# Altium schematic symbol library Minh_Lib.SchLib: 619 symbols (part 1 of 4) (continued)
## C1206C106J4RACTU
designator C?  Supplier Part Number 1: 96Y5637
Cap Ceramic 10uF 16V X7R 5% SMD 1206 125C Plastic T/R; Manufacturer: KEMET; Manufacturer Part Number: C1206C106J4RACTU; Supplier 1: Newark; RoHS: Yes; Category: Ceramic Capacitors; Stock 1: 60; Pricing 1: 5=3.14000, 10=2.49000, 25=2.30000, 50=2.11000, 100=1.93000 (USD); Mount: Surface Mount; Case/Package: 1206; Dielectric Material: Ceramic; Case Code (Metric): 3216; Case Code (Imperial): 1206; Min Operating Temperature: -55°C; Max Operating Temperature: 125°C; Capacitance: 10uF; Tolerance: 5%; Voltage Rating (DC): 16V; Dielectric: X7R; Package Quantity: 1; Voltage Rating: 16V; Packaging: Tape and Reel; Termination: SMD/SMT; Dissipation Factor: 5%; Series: C; Length: 3.2mm; Width: 0.063inch; Height: 1.6mm; Thickness: 0.071inch; Depth: 1.6mm; Radiation Hardening: No; RoHS Compliant: Yes; REACH SVHC: No SVHC; ComponentLink1URL: http://www.farnell.com/datasheets/2746115.pdf?src-supplier=Farnell; ComponentLink1Description: http://www.farnell.com/datasheets/2746115.pdf?src-supplier=Farnell; ComponentLink2URL: http://www.mouser.com/ds/2/212/KEM_C1002_X7R_SMD-1102033.pdf?src-supplier=Mouser; ComponentLink2Description: http://www.mouser.com/ds/2/212/KEM_C1002_X7R_SMD-1102033.pdf?src-supplier=Mouser; ComponentLink3URL: http://components.arrow.com/part/dataview/0323_00339521?src-supplier=Arrow+Europe; ComponentLink3Description: http://components.arrow.com/part/dataview/0323_00339521?src-supplier=Arrow+Europe; ComponentLink4URL: http://components.arrow.com/part/dataview/46514886S8616008N7429?src-supplier=Arrow+Electronics; ComponentLink4Description: http://components.arrow.com/part/dataview/46514886S8616008N7429?src-supplier=Arrow+Electronics; ComponentLink5URL: https://api.kemet.com/component-edge/download/datasheet/C1206C106J4RACTU.pdf?src-supplier=Digi-Key; ComponentLink5Description: https://api.kemet.com/component-edge/download/datasheet/C1206C106J4RACTU.pdf?src-supplier=Digi-Key; ComponentLink6URL: http://www.farnell.com/datasheets/2746115.pdf?src-supplier=Newark; ComponentLink6Description: http://www.farnell.com/datasheets/2746115.pdf?src-supplier=Newark; ComponentLink7URL: http://capacitoredge.kemet.com/capedge2/DataSheet?pn=C1206C106J4RAC7800&src-supplier=Avnet; ComponentLink7Description: http://capacitoredge.kemet.com/capedge2/DataSheet?pn=C1206C106J4RAC7800&src-supplier=Avnet; ComponentLink8URL: http://www.farnell.com/datasheets/2746115.pdf?src-supplier=Element14; ComponentLink8Description: http://www.farnell.com/datasheets/2746115.pdf?src-supplier=Element14
footprint CAP1206
pins: 1, 2

## C1206C106J8RACTU
designator C?  Supplier Part Number 1: 96Y7254
Cap Ceramic 10uF 10V X7R 5% SMD 1206 125°C Embossed Plastic T/R; Manufacturer: KEMET; Manufacturer Part Number: C1206C106J8RACTU; Supplier 1: Newark; RoHS: Yes; Category: Ceramic Capacitors; Stock 1: 711; Pricing 1: 1=0.48700, 10=0.48700, 25=0.48700, 50=0.48700, 100=0.48700 (USD); Mount: Surface Mount; Case/Package: 1206; Case Code (Imperial): 1206; Case Code (Metric): 3216; Dielectric Material: Ceramic; Min Operating Temperature: -55°C; Max Operating Temperature: 125°C; Capacitance: 10uF; Tolerance: 5%; Packaging: Tape and Reel; Dielectric: X7R; Voltage Rating (DC): 10V; Termination: SMD/SMT; Series: C; Package Quantity: 1; Voltage Rating: 10V; Length: 0.126inch; Width: 0.063inch; Depth: 1.6mm; Thickness: 0.071inch; RoHS Compliant: Yes; ComponentLink1URL: http://www.farnell.com/datasheets/2323763.pdf?src-supplier=Farnell; ComponentLink1Description: http://www.farnell.com/datasheets/2323763.pdf?src-supplier=Farnell; ComponentLink2URL: http://www.farnell.com/datasheets/2746428.pdf?src-supplier=Farnell; ComponentLink2Description: http://www.farnell.com/datasheets/2746428.pdf?src-supplier=Farnell; ComponentLink3URL: http://www.mouser.com/ds/2/212/KEM_C1002_X7R_SMD-1102033.pdf?src-supplier=Mouser; ComponentLink3Description: http://www.mouser.com/ds/2/212/KEM_C1002_X7R_SMD-1102033.pdf?src-supplier=Mouser; ComponentLink4URL: http://components.arrow.com/part/dataview/0323_00339679?src-supplier=Arrow+Europe; ComponentLink4Description: http://components.arrow.com/part/dataview/0323_00339679?src-supplier=Arrow+Europe; ComponentLink5URL: http://components.arrow.com/part/dataview/46514937S98325N7429?src-supplier=Arrow+Electronics; ComponentLink5Description: http://components.arrow.com/part/dataview/46514937S98325N7429?src-supplier=Arrow+Electronics; ComponentLink6URL: https://api.kemet.com/component-edge/download/datasheet/C1206C106J8RACTU.pdf?src-supplier=Digi-Key; ComponentLink6Description: https://api.kemet.com/component-edge/download/datasheet/C1206C106J8RACTU.pdf?src-supplier=Digi-Key; ComponentLink7URL: http://www.farnell.com/datasheets/2746428.pdf?src-supplier=Newark; ComponentLink7Description: http://www.farnell.com/datasheets/2746428.pdf?src-supplier=Newark; ComponentLink8URL: https://search.kemet.com/component-edge/download/datasheet/C1206C106J8RACTU.pdf?src-supplier=Digi-Key; ComponentLink8Description: https://search.kemet.com/component-edge/download/datasheet/C1206C106J8RACTU.pdf?src-supplier=Digi-Key
footprint CAP1206
pins: 1, 2

## C1206C106J9RACTU
designator C?  Supplier Part Number 1: 08P7799
Cap Cer 10UF 6.3V 5% X7R 1206; Manufacturer: KEMET; Manufacturer Part Number: C1206C106J9RACTU; Dielectric Material: Ceramic; Supplier 1: Newark; RoHS: Yes; Category: Ceramic Capacitors; Pricing 1: 2000=0.87500 (USD); Mount: Surface Mount; Case/Package: 1206; Min Operating Temperature: -55°C; Max Operating Temperature: 125°C; Capacitance: 10uF; Tolerance: 5%; Packaging: Tape and Reel; Package Quantity: 2000; Voltage Rating: 6.3V; Voltage Rating (DC): 6.3V; Length: 0.126inch; Width: 0.063inch; Thickness: 0.071inch; RoHS Compliant: Yes; ComponentLink1URL: https://search.kemet.com/component-edge/download/datasheet/C1206C106J9RACTU.pdf?src-supplier=Digi-Key; ComponentLink1Description: https://search.kemet.com/component-edge/download/datasheet/C1206C106J9RACTU.pdf?src-supplier=Digi-Key
footprint CAP1206
pins: 1, 2

## C1206C106K3PACTU
designator C?  Supplier Part Number 1: 6911199
贴片陶瓷电容 10uF ±10% 25V 1206; Manufacturer: KEMET; Manufacturer Part Number: C1206C106K3PACTU; Dielectric Material: Ceramic; Dielectric: X5R; Supplier 1: RSComponents; RoHS: Yes; Category: Ceramic Capacitors; Stock 1: 8950; Pricing 1: 10=0.72400, 50=0.68100, 100=0.63600, 250=0.59300, 500=0.54300 (USD); Mount: Surface Mount; Case/Package: 1206; Case Code (Imperial): 1206; Case Code (Metric): 3216; Min Operating Temperature: -55°C; Max Operating Temperature: 85°C; Capacitance: 10uF; Tolerance: 10%; Packaging: Tape and Reel; Voltage Rating: 25V; Voltage: 25V; Termination: SMD/SMT; Construction: Flat; Length: 3.2mm; Height: 1.6mm; Depth: 1.6mm; Radiation Hardening: No; RoHS Compliant: Yes; ComponentLink1URL: http://www.farnell.com/datasheets/2739687.pdf?src-supplier=Farnell; ComponentLink1Description: http://www.farnell.com/datasheets/2739687.pdf?src-supplier=Farnell; ComponentLink2URL: http://components.arrow.com/part/dataview/0323_00011384?src-supplier=Arrow+Europe; ComponentLink2Description: http://components.arrow.com/part/dataview/0323_00011384?src-supplier=Arrow+Europe; ComponentLink3URL: http://www.onlinecomponents.com/productFiles/mf-KEM/kem_c1006_x5r_smd.pdf?src-supplier=Onlinecomponents.com; ComponentLink3Description: http://www.onlinecomponents.com/productFiles/mf-KEM/kem_c1006_x5r_smd.pdf?src-supplier=Onlinecomponents.com; ComponentLink4URL: https://www.verical.com/server-webapp/html/getDatasheet?partID=385834&src-supplier=Verical; ComponentLink4Description: https://www.verical.com/server-webapp/html/getDatasheet?partID=385834&src-supplier=Verical; ComponentLink5URL: http://www.farnell.com/datasheets/2739687.pdf?src-supplier=Element14; ComponentLink5Description: http://www.farnell.com/datasheets/2739687.pdf?src-supplier=Element14; ComponentLink6URL: http://www.farnell.com/datasheets/2739687.pdf?src-supplier=Newark; ComponentLink6Description: http://www.farnell.com/datasheets/2739687.pdf?src-supplier=Newark; ComponentLink7URL: https://api.kemet.com/component-edge/download/datasheet/C1206C106K3PACTU.pdf?src-supplier=Digi-Key; ComponentLink7Description: https://api.kemet.com/component-edge/download/datasheet/C1206C106K3PACTU.pdf?src-supplier=Digi-Key
footprint CAP1206
pins: 1, 2

## C1206C106K4RACTU
designator C?  Supplier Part Number 1: 8029961
1206 C 10uF Ceramic Multilayer Capacitor; 16 VDC; +125degC; X7R Dielec; +/-10%; Manufacturer: KEMET; Manufacturer Part Number: C1206C106K4RACTU; Tolerance: 10%; Voltage Rating (DC): 16V; Dissipation Factor: 5%; Supplier 1: RSComponents; RoHS: Yes; Category: Ceramic Capacitors; Stock 1: 350; Pricing 1: 50=0.19000, 250=0.08200, 1000=0.07300 (USD); Mount: Surface Mount,PCB; Case/Package: 1206; Dielectric Material: Ceramic; Case Code (Metric): 3216; Case Code (Imperial): 1206; Min Operating Temperature: -55°C; Max Operating Temperature: 125°C; Capacitance: 10uF; Packaging: Tape and Reel; Dielectric: X7R; Termination: SMD/SMT; Voltage Rating: 16V; Series: C; Package Quantity: 1; Construction: Flat; Voltage: 16V; Length: 3.2mm; Width: 0.063inch; Height: 1.6mm; Depth: 1.6mm; Thickness: 0.071inch; Radiation Hardening: No; RoHS Compliant: Yes; REACH SVHC: No SVHC; ComponentLink1URL: https://datasheet.ciiva.com/5969/1732730-5969445.pdf?src-supplier=Farnell; ComponentLink1Description: https://datasheet.ciiva.com/5969/1732730-5969445.pdf?src-supplier=Farnell; ComponentLink2URL: https://datasheet.ciiva.com/5412/kem-c1002-x7r-smd-5412965.pdf?src-supplier=Mouser; ComponentLink2Description: https://datasheet.ciiva.com/5412/kem-c1002-x7r-smd-5412965.pdf?src-supplier=Mouser; ComponentLink3URL: https://datasheet.ciiva.com/14586/70095383-14586759.pdf?src-supplier=Allied+Electronics; ComponentLink3Description: https://datasheet.ciiva.com/14586/70095383-14586759.pdf?src-supplier=Allied+Electronics; ComponentLink4URL: https://datasheet.ciiva.com/14599/70095383-14599882.pdf?src-supplier=Allied+Electronics; ComponentLink4Description: https://datasheet.ciiva.com/14599/70095383-14599882.pdf?src-supplier=Allied+Electronics; ComponentLink5URL: https://datasheet.ciiva.com/7730/1851736-7730091.pdf?src-supplier=Element14; ComponentLink5Description: https://datasheet.ciiva.com/7730/1851736-7730091.pdf?src-supplier=Element14; ComponentLink6URL: https://datasheet.ciiva.com/18102/getdatasheetpartid-74004-18102523.pdf?src-supplier=Verical; ComponentLink6Description: https://datasheet.ciiva.com/18102/getdatasheetpartid-74004-18102523.pdf?src-supplier=Verical; ComponentLink7URL: https://datasheet.ciiva.com/7730/1851736-7730092.pdf?src-supplier=Element14; ComponentLink7Description: https://datasheet.ciiva.com/7730/1851736-7730092.pdf?src-supplier=Element14; ComponentLink8URL: https://datasheet.ciiva.com/28682/1851736-28682380.pdf?src-supplier=Element14; ComponentLink8Description: https://datasheet.ciiva.com/28682/1851736-28682380.pdf?src-supplier=Element14
footprint CAP1206
pins: 1, 2

## C1206C106K8RACTU
designator C?  Supplier Part Number 1: 6911209
Cap Ceramic 10uF 10V X7R 10% Pad SMD 1206 125°C T/R; Manufacturer: KEMET; Manufacturer Part Number: C1206C106K8RACTU; Dissipation Factor: 5%; Supplier 1: RSComponents; RoHS: Yes; Category: Ceramic Capacitors; Stock 1: 1; Pricing 1: 10=0.44400, 50=0.37800, 100=0.33200, 250=0.28800, 1000=0.26800 (USD); Mount: Surface Mount,PCB; Case/Package: 1206; Dielectric Material: Ceramic; Case Code (Imperial): 1206; Case Code (Metric): 3216; Min Operating Temperature: -55°C; Max Operating Temperature: 125°C; Capacitance: 10uF; Tolerance: 10%; Packaging: Tape and Reel; Dielectric: X7R; Voltage Rating (DC): 10V; Termination: SMD/SMT; Voltage Rating: 10V; Package Quantity: 1; Construction: Flat; Series: C; Voltage: 10V; Length: 3.2mm; Width: 1.6mm; Height: 1.6mm; Depth: 1.6mm; Thickness: 0.071inch; Radiation Hardening: No; RoHS Compliant: Yes; REACH SVHC: No SVHC; ComponentLink1URL: https://datasheet.ciiva.com/7729/1697708-7729824.pdf?src-supplier=Element14; ComponentLink1Description: https://datasheet.ciiva.com/7729/1697708-7729824.pdf?src-supplier=Element14; ComponentLink2URL: https://datasheet.ciiva.com/14588/70095383-14588311.pdf?src-supplier=Allied+Electronics; ComponentLink2Description: https://datasheet.ciiva.com/14588/70095383-14588311.pdf?src-supplier=Allied+Electronics; ComponentLink3URL: https://datasheet.ciiva.com/14606/70095383-14606985.pdf?src-supplier=Allied+Electronics; ComponentLink3Description: https://datasheet.ciiva.com/14606/70095383-14606985.pdf?src-supplier=Allied+Electronics
footprint CAP1206
pins: 1, 2

## C1206C106K9RACTU
designator C?  Supplier Part Number 1: 32K5011
1206 C 10uF Ceramic Multilayer Capacitor; 6.3 VDC; +125degC; X7R Dielec; +/-10%; Manufacturer: KEMET; Manufacturer Part Number: C1206C106K9RACTU; Tolerance: 10%; Voltage Rating (DC): 6.3V; Supplier 1: Newark; RoHS: Yes; Category: Ceramic Capacitors; Stock 1: 2000; Pricing 1: 1=0.24900, 2000=0.24900 (USD); Mount: Surface Mount,PCB; Case/Package: 1206; Dielectric Material: Ceramic; Case Code (Metric): 3216; Case Code (Imperial): 1206; Min Operating Temperature: -55°C; Max Operating Temperature: 125°C; Capacitance: 10uF; Packaging: Cut Tape; Dielectric: X7R; Voltage Rating: 6.3V; Package Quantity: 1; Termination: SMD/SMT; Series: C; Construction: Flat; Dissipation Factor: 10%; Voltage: 6.3V; Length: 3.2mm; Width: 0.063inch; Height: 1.6mm; Depth: 1.6mm; Thickness: 0.071inch; Radiation Hardening: No; RoHS Compliant: Yes; REACH SVHC: No SVHC; ComponentLink1URL: https://datasheet.ciiva.com/14592/70095383-14592203.pdf?src-supplier=Allied+Electronics; ComponentLink1Description: https://datasheet.ciiva.com/14592/70095383-14592203.pdf?src-supplier=Allied+Electronics
footprint CAP1206
pins: 1, 2

## C3216JB1V226M160AC
designator C?, comment 22uF-1206  Tolerance: ±20%  Voltage - Rated: 35V
CAP CER 22UF 35V JB 1206; Manufacturer: TDK Corporation; Manufacturer Part Number: C3216JB1V226M160AC; Supplier 1: Digi-Key; RoHS: RoHS Compliant; Category: Capacitors; Stock 1: 191458; Pricing 1: 1=1.06, 10=0.835, 100=0.6262, 500=0.47312, 1000=0.41745 (USD); Packaging: Cut Tape (CT); Part Status: Active; Temperature Coefficient: JB; Operating Temperature: -25°C ~ 85°C; Features: Low ESL; Ratings: -; Applications: General Purpose; Failure Rate: -; Mounting Type: Surface Mount, MLCC; Package / Case: 1206 (3216 Metric); Size / Dimension: 0.126" L x 0.063" W (3.20mm x 1.60mm); Height - Seated (Max): -; Thickness (Max): 0.069" (1.75mm); Lead Spacing: -; Lead Style: -; ComponentLink1URL: https://product.tdk.com/info/en/catalog/datasheets/mlcc_commercial_general_en.pdf; ComponentLink1Description: https://product.tdk.com/info/en/catalog/datasheets/mlcc_commercial_general_en.pdf; Supplier Part Number 1: 445-11739-1-ND; Value: 22uF
footprint CAP1206
pins: 1, 2

## Cap_1nF_2.5KV
designator C?, comment 1nF-2.5KV
footprint CAP1206_THG
pins: 1, 2

## Capacitor
designator C?, comment Capacitor SMD
Capacitor SMD 0603
footprint CAP0603 (Capacitor SMD 0603 ( imperal ))
pins: 1, 2

## Capacitor SMD - T491A106K016AT
designator C?, comment 10uF - 1206
Cap Tant Solid 10uF 16V A CASE 10% (3.2 X 1.6 X 1.6mm) Inward L SMD 3216-18 3 Ohm 125C T/R; Manufacturer: KEMET; Manufacturer Part Number: T491A106K016AT; Dielectric Material: Tantalum; ESR (Equivalent Series Resistance): 7R; Polarity: Polar; Life (Hours): 2000Hour; Leakage Current: 1.6uA; Ripple Current: 104mA; Supplier 1: Avnet; RoHS: Yes; Category: Tantalum Capacitors; Stock 1: 4000; Pricing 1: 2000=0.16400 (USD); Mount: Surface Mount,PCB; Case/Package: 1206; Number of Pins: 2; Case Code (Metric): 3216; Case Code (Imperial): 1206; Min Operating Temperature: -55°C; Max Operating Temperature: 125°C; Capacitance: 10uF; Tolerance: 10%; Voltage Rating: 16V; Packaging: Tape and Reel; Termination: SMD/SMT; Package Quantity: 1; Dissipation Factor: 10%; Voltage Rating (DC): 16V; Voltage: 16V; Features: General Purpose; Failure Rate: 0.001%; Length: 3.2mm; Width: 1.6mm; Height: 1.6mm; Depth: 1.6mm; Height - Seated (Max): 0.071inch; Lead Pitch: 1.2mm; Radiation Hardening: No; RoHS Compliant: Yes; REACH SVHC: No SVHC; Lead Free: Lead Free; ComponentLink1URL: https://datasheet.ciiva.com/7696/1732745-7696294.pdf?src-supplier=Element14; ComponentLink1Description: https://datasheet.ciiva.com/7696/1732745-7696294.pdf?src-supplier=Element14; ComponentLink2URL: https://datasheet.ciiva.com/34302/1573257-34302505.pdf?src-supplier=Jameco; ComponentLink2Description: https://datasheet.ciiva.com/34302/1573257-34302505.pdf?src-supplier=Jameco; ComponentLink3URL: https://datasheet.ciiva.com/7696/1923792-7696431.pdf?src-supplier=Element14; ComponentLink3Description: https://datasheet.ciiva.com/7696/1923792-7696431.pdf?src-supplier=Element14; ComponentLink4URL: https://datasheet.ciiva.com/7696/1854511-7696295.pdf?src-supplier=Element14; ComponentLink4Description: https://datasheet.ciiva.com/7696/1854511-7696295.pdf?src-supplier=Element14; ComponentLink5URL: https://datasheet.ciiva.com/14113/t491serie-eng-tds-14113132.pdf?src-supplier=Distrelec; ComponentLink5Description: https://datasheet.ciiva.com/14113/t491serie-eng-tds-14113132.pdf?src-supplier=Distrelec; ComponentLink6URL: https://datasheet.ciiva.com/7696/1446014-7696296.pdf?src-supplier=Element14; ComponentLink6Description: https://datasheet.ciiva.com/7696/1446014-7696296.pdf?src-supplier=Element14; ComponentLink7URL: https://datasheet.ciiva.com/7696/1854511-7696293.pdf?src-supplier=Element14; ComponentLink7Description: https://datasheet.ciiva.com/7696/1854511-7696293.pdf?src-supplier=Element14; ComponentLink8URL: https://datasheet.ciiva.com/6248/kem-t2005-t491-6248088.pdf?src-supplier=Digi-Key; ComponentLink8Description: https://datasheet.ciiva.com/6248/kem-t2005-t491-6248088.pdf?src-supplier=Digi-Key; ComponentLink9URL: https://datasheet.ciiva.com/6248/kem-t2005-t491-6248087.pdf?src-supplier=Digi-Key; ComponentLink9Description: https://datasheet.ciiva.com/6248/kem-t2005-t491-6248087.pdf?src-supplier=Digi-Key; ComponentLink10URL: https://datasheet.ciiva.com/6248/kem-t2005-t491-6248089.pdf?src-supplier=Digi-Key; ComponentLink10Description: https://datasheet.ciiva.com/6248/kem-t2005-t491-6248089.pdf?src-supplier=Digi-Key; ComponentLink11URL: https://datasheet.ciiva.com/14586/70095774-14586694.pdf?src-supplier=Allied+Electronics; ComponentLink11Description: https://datasheet.ciiva.com/14586/70095774-14586694.pdf?src-supplier=Allied+Electronics; ComponentLink12URL: https://datasheet.ciiva.com/14605/70095774-14605543.pdf?src-supplier=Allied+Electronics; ComponentLink12Description: https://datasheet.ciiva.com/14605/70095774-14605543.pdf?src-supplier=Allied+Electronics; ComponentLink13URL: https://datasheet.ciiva.com/12882/kem-t2005-t491-12882730.pdf?src-supplier=Mouser; ComponentLink13Description: https://datasheet.ciiva.com/12882/kem-t2005-t491-12882730.pdf?src-supplier=Mouser; ComponentLink14URL: https://datasheet.ciiva.com/39123/kem-t2005-t491-39123278.pdf?src-supplier=Onlinecomponents.com; ComponentLink14Description: https://datasheet.ciiva.com/39123/kem-t2005-t491-39123278.pdf?src-supplier=Onlinecomponents.com; ComponentLink15URL: https://datasheet.ciiva.com/29244/458306-da-01-de-kondensator-10uf-3216-10pr-16v-85c-29244588.pdf?src-supplier=Conrad; ComponentLink15Description: https://datasheet.ciiva.com/29244/458306-da-01-de-kondensator-10uf-3216-10pr-16v-85c-29244588.pdf?src-supplier=Conrad
footprint CAP1206_TANT
pins: 1, 2
text: +

## CC0603DRNPO9BN8R2
designator C?, comment 8.2pF-0603
CAP CER 8.2PF 50V C0G/NPO 0603; Manufacturer: Yageo; Manufacturer Part Number: CC0603DRNPO9BN8R2; Tolerance: ±0.5pF; Temperature Coefficient: C0G, NP0; Supplier 1: Digi-Key; RoHS: RoHS Compliant; Category: Capacitors; Stock 1: 53201; Pricing 1: 1=0.1, 10=0.041, 100=0.0181, 500=0.01292, 1000=0.01015 (USD); Packaging: Cut Tape (CT); Part Status: Active; Voltage - Rated: 50V; Operating Temperature: -55°C ~ 125°C; Features: -; Ratings: -; Applications: General Purpose; Failure Rate: -; Mounting Type: Surface Mount, MLCC; Package / Case: 0603 (1608 Metric); Size / Dimension: 0.063" L x 0.032" W (1.60mm x 0.80mm); Height - Seated (Max): -; Thickness (Max): 0.035" (0.90mm); Lead Spacing: -; Lead Style: -; ComponentLink1URL: http://www.yageo.com/documents/recent/UPY-GP_NP0_16V-to-50V_16.pdf; ComponentLink1Description: http://www.yageo.com/documents/recent/UPY-GP_NP0_16V-to-50V_16.pdf; Supplier Part Number 1: 311-1742-1-ND; Value: 8.2pF
footprint CAP0603 (Capacitor SMD 0603 ( imperal ))
pins: 1, 2

## CC0603DRNPO9BN100
designator C?, comment 10pF-0603
Multilayer Ceramic Capacitors MLCC - SMD/SMT 10pF 50V NPO .50pF; Manufacturer: Yageo; Manufacturer Part Number: CC0603DRNPO9BN100; Tolerance: 0.5 pF; Type: General Purpose Surface-Mount Ceramic Multilayer Capacitor; Class: Class 1; Dielectric: C0G (NP0); Supplier 1: Mouser; RoHS: RoHS Compliant By Exemption; Category: Multilayer Ceramic Capacitors MLCC - SMD/SMT; Stock 1: 10983; Pricing 1: 1=0.100, 10=0.059, 100=0.024, 1000=0.020, 4000=0.015, 8000=0.013, 48000=0.012, 100000=0.010 (USD); Capacitance: 10 pF; Height: 0.8 mm; Length: 1.6 mm; Package / Case: 0603 (1608 metric); Packaging: Cut Tape; Product: General Type MLCCs; Series: CC; Termination Style: SMD/SMT; Voltage Rating DC: 50 V; Width: 0.8 mm; Brand: Yageo; Case Code - in: 0603; Case Code - mm: 1608; Maximum Operating Temperature: + 125 C; Minimum Operating Temperature: - 55 C; Product Type: Ceramic Capacitors; Standard Pack Qty: 4000; Subcategory: Capacitors; Termination: Standard; RoHS - Mouser: E; Minimum Order Quantity: 1; Reeling: True; ComponentLink1URL: https://www.mouser.com/datasheet/2/447/UPY-GP_NP0_16V-to-50V_16-1109089.pdf; ComponentLink1Description: https://www.mouser.com/datasheet/2/447/UPY-GP_NP0_16V-to-50V_16-1109089.pdf; Supplier Part Number 1: 603-CC603DRNPO9BN100; Value: 10pF
footprint CAP0603 (Capacitor SMD 0603 ( imperal ))
pins: 1, 2

## CC0603JRNPO9BN100
designator C?, comment 10pF-0603
Multilayer Ceramic Capacitors MLCC - SMD/SMT 10PF 50V 5% 0603; Manufacturer: Yageo; Manufacturer Part Number: CC0603JRNPO9BN100; Type: General Purpose Surface-Mount Ceramic Multilayer Capacitor; Class: Class 1; Dielectric: C0G (NP0); Supplier 1: Mouser; RoHS: RoHS Compliant; Category: Multilayer Ceramic Capacitors MLCC - SMD/SMT; Stock 1: 546838; Pricing 1: 1=0.100, 10=0.042, 100=0.019, 1000=0.015, 4000=0.011, 8000=0.010, 48000=0.009, 100000=0.007 (USD); Capacitance: 10 pF; Height: 0.8 mm; Length: 1.6 mm; Package / Case: 0603 (1608 metric); Packaging: Cut Tape; Product: General Type MLCCs; Series: CC; Termination Style: SMD/SMT; Tolerance: 5 %; Voltage Rating DC: 50 V; Width: 0.8 mm; Brand: Yageo; Case Code - in: 0603; Case Code - mm: 1608; Maximum Operating Temperature: + 125 C; Minimum Operating Temperature: - 55 C; Product Type: Ceramic Capacitors; Standard Pack Qty: 4000; Subcategory: Capacitors; Termination: Standard; RoHS - Mouser: Y; Minimum Order Quantity: 1; Reeling: True; ComponentLink1URL: https://www.mouser.com/datasheet/2/447/UPY-GP_NP0_16V-to-50V_16-1109089.pdf; ComponentLink1Description: https://www.mouser.com/datasheet/2/447/UPY-GP_NP0_16V-to-50V_16-1109089.pdf; Supplier Part Number 1: 603-C0603JRNPO9BN100; Value: 10pF
footprint CAP0603 (Capacitor SMD 0603 ( imperal ))
pins: 1, 2

## CC0603JRNPO9BN120
designator C?, comment 12pF-0603
Multilayer Ceramic Capacitors MLCC - SMD/SMT 12pF 50V NPO 5%; Manufacturer: Yageo; Manufacturer Part Number: CC0603JRNPO9BN120; Type: Multilayer Ceramic Chip Capacitor; Voltage Rating DC: 50 VDC; Class: Class 1; Dielectric: C0G (NP0); Supplier 1: Mouser; RoHS: RoHS Compliant; Category: Multilayer Ceramic Capacitors MLCC - SMD/SMT; Stock 1: 0; Pricing 1: 1=0.100, 10=0.021, 100=0.010, 1000=0.008, 4000=0.006, 8000=0.005, 100000=0.004 (USD); Capacitance: 12 pF; Length: 1.6 mm; Package / Case: 0603 (1608 metric); Packaging: Cut Tape; Product: General Type MLCCs; Series: CC-NPO-BN; Termination Style: SMD/SMT; Tolerance: 5 %; Width: 0.8 mm; Brand: Yageo; Case Code - in: 0603; Case Code - mm: 1608; Maximum Operating Temperature: + 125 C; Minimum Operating Temperature: - 55 C; Standard Pack Qty: 4000; Termination: -; RoHS - Mouser: E; Minimum Order Quantity: 1; Reeling: True; ComponentLink1URL: https://www.mouser.com/ds/2/447/Yageo_UPY-GP_NP0_16V-to-50V_9-1211922.pdf; ComponentLink1Description: https://www.mouser.com/ds/2/447/Yageo_UPY-GP_NP0_16V-to-50V_9-1211922.pdf; Supplier Part Number 1: 603-CC603JRNPO9BN120; Value: 12pF
footprint CAP0603 (Capacitor SMD 0603 ( imperal ))
pins: 1, 2

## CC0603JRNPO9BN180
designator C?, comment 18pF-0603
Multilayer Ceramic Capacitors MLCC - SMD/SMT 18pF 50V NPO 5%; Manufacturer: Yageo; Manufacturer Part Number: CC0603JRNPO9BN180; Type: General Purpose Surface-Mount Ceramic Multilayer Capacitor; Voltage Rating DC: 50 VDC; Class: Class 1; Dielectric: C0G (NP0); Supplier 1: Mouser; RoHS: RoHS Compliant; Category: Multilayer Ceramic Capacitors MLCC - SMD/SMT; Stock 1: 163380; Pricing 1: 1=0.100, 10=0.038, 100=0.014, 1000=0.011, 4000=0.008, 8000=0.007 (USD); Capacitance: 18 pF; Height: 0.8 mm; Length: 1.6 mm; Package / Case: 0603 (1608 metric); Packaging: Cut Tape; Product: General Type MLCCs; Series: CC; Termination Style: SMD/SMT; Tolerance: 5 %; Width: 0.8 mm; Brand: Yageo; Case Code - in: 0603; Case Code - mm: 1608; Maximum Operating Temperature: + 125 C; Minimum Operating Temperature: - 55 C; Product Type: Ceramic Capacitors; Standard Pack Qty: 4000; Subcategory: Capacitors; Termination: Standard; RoHS - Mouser: Y; Minimum Order Quantity: 1; Reeling: True; ComponentLink1URL: https://www.mouser.com/catalog/specsheets/yageo_yago-s-a0008592767-1.pdf; ComponentLink1Description: https://www.mouser.com/catalog/specsheets/yageo_yago-s-a0008592767-1.pdf; Supplier Part Number 1: 603-CC603JRNPO9BN180; Value: 18pF
footprint CAP0603 (Capacitor SMD 0603 ( imperal ))
pins: 1, 2

## CC0603JRNPO9BN200
designator C?, comment 20pF-0603
CAP CER 20PF 50V C0G/NPO 0603; Manufacturer 1: Yageo; Manufacturer Part Number 1: CC0603JRNPO9BN200; Category 1: Capacitors; Tolerance: ±5%; Temperature Coefficient: C0G, NP0; Supplier 1: Digi-Key; Supplier Part Number 1: 311-1424-1-ND; RoHS 1: RoHS Compliant; Description 1: CAP CER 20PF 50V C0G/NPO 0603; Stock 1: 67895; Pricing 1: 1=0.1, 10=0.037, 100=0.0164, 500=0.01172, 1000=0.0092 (USD); Packaging: Cut Tape (CT); Part Status: Active; Capacitance: 20pF; Voltage - Rated: 50V; Operating Temperature: -55°C ~ 125°C; Features: -; Ratings: -; Applications: General Purpose; Failure Rate: -; Mounting Type: Surface Mount, MLCC; Package / Case: 0603 (1608 Metric); Size / Dimension: 0.063" L x 0.031" W (1.60mm x 0.80mm); Height - Seated (Max): -; Thickness (Max): 0.035" (0.90mm); Lead Spacing: -; Lead Style: -; ComponentLink1URL: http://www.yageo.com/documents/recent/UPY-GP_NP0_16V-to-50V_16.pdf; ComponentLink1Description: http://www.yageo.com/documents/recent/UPY-GP_NP0_16V-to-50V_16.pdf; Value: 20pF
footprint CAP0603 (Capacitor SMD 0603 ( imperal ))
pins: 1, 2

## CC0603JRNPO9BN201
designator C?, comment 200pF-0603
CAP CER 200PF 50V C0G/NPO 0603; Manufacturer: Yageo; Manufacturer Part Number: CC0603JRNPO9BN201; Tolerance: ±5%; Temperature Coefficient: C0G, NP0; Notification: Current market demand for these product types have resulted in fluctuating and extending lead times. Lead times may differ.; Supplier 1: Digi-Key; RoHS: RoHS Compliant; Category: Capacitors; Stock 1: 21005; Pricing 1: 1=0.17, 10=0.12, 100=0.0562, 500=0.03942, 1000=0.03263 (USD); Packaging: Cut Tape (CT); Part Status: Active; Voltage - Rated: 50V; Operating Temperature: -55°C ~ 125°C; Features: -; Ratings: -; Applications: General Purpose; Failure Rate: -; Mounting Type: Surface Mount, MLCC; Package / Case: 0603 (1608 Metric); Size / Dimension: 0.063" L x 0.031" W (1.60mm x 0.80mm); Height - Seated (Max): -; Thickness (Max): 0.035" (0.90mm); Lead Spacing: -; Lead Style: -; ComponentLink1URL: http://www.yageo.com/documents/recent/UPY-GP_NP0_16V-to-50V_16.pdf; ComponentLink1Description: http://www.yageo.com/documents/recent/UPY-GP_NP0_16V-to-50V_16.pdf; Supplier Part Number 1: 311-1770-1-ND; Value: 200pF
footprint CAP0603 (Capacitor SMD 0603 ( imperal ))
pins: 1, 2

## CC0603JRNPO9BN220
designator C?  Supplier Part Number 1: 46WX087
Surface Mount Ceramic Multilayer Capacitor 22pF 5% C0G 50V 0603 Paper T/R; Manufacturer: Yageo; Manufacturer Part Number: CC0603JRNPO9BN220; Insulation Resistance: 10GR; Temperature Coefficient: 30ppm/°C; Supplier 1: Newark; RoHS: Yes; Category: Ceramic Capacitors; Stock 1: 70605; Pricing 1: 1=0.10000, 10=0.02100, 25=0.02000, 50=0.01900, 100=0.01800 (USD); Mount: Surface Mount; Case/Package: 0603; Number of Pins: 2; Case Code (Imperial): 0603; Case Code (Metric): 1608; Min Operating Temperature: -55°C; Max Operating Temperature: 125°C; Capacitance: 22pF; Tolerance: 5%; Voltage Rating: 50V; Packaging: Tape and Reel; Dielectric: C0G; Termination: SMD/SMT; Series: CC; Voltage Rating (DC): 50V; Package Quantity: 1; Voltage: 50V; Length: 1.6mm; Width: 0.031inch; Height: 0.8mm; Thickness: 0.035inch; Depth: 0.8mm; Radiation Hardening: No; Lead Free: Lead Free; RoHS Compliant: Yes; Reach SVHC Compliant: Yes
footprint CAP0603 (Capacitor SMD 0603 ( imperal ))
pins: 1, 2

## CC0603JRNPO9BN300
designator C?, comment 30pF-0603
CAP CER 30PF 50V NPO 0603; Manufacturer: Yageo; Manufacturer Part Number: CC0603JRNPO9BN300; Tolerance: ±5%; Temperature Coefficient: C0G, NP0; Notification: Current market demand for these product types have resulted in fluctuating and extending lead times. Lead times may differ.; Supplier 1: Digi-Key; RoHS: RoHS Compliant; Category: Capacitors; Stock 1: 0; Pricing 1: 1=0.1, 10=0.041, 100=0.0182, 500=0.01302, 1000=0.01022 (USD); Packaging: Cut Tape (CT); Part Status: Active; Voltage - Rated: 50V; Operating Temperature: -55°C ~ 125°C; Features: -; Ratings: -; Applications: General Purpose; Failure Rate: -; Mounting Type: Surface Mount, MLCC; Package / Case: 0603 (1608 Metric); Size / Dimension: 0.063" L x 0.032" W (1.60mm x 0.80mm); Height - Seated (Max): -; Thickness (Max): 0.035" (0.90mm); Lead Spacing: -; Lead Style: -; ComponentLink1URL: http://www.yageo.com/documents/recent/UPY-GP_NP0_16V-to-50V_16.pdf; ComponentLink1Description: http://www.yageo.com/documents/recent/UPY-GP_NP0_16V-to-50V_16.pdf; Supplier Part Number 1: 311-3357-1-ND
footprint CAP0603 (Capacitor SMD 0603 ( imperal ))
pins: 1, 2

## CC0603JRNPO9BN330
designator C?, comment 33pF-0603
Multilayer Ceramic Capacitors MLCC - SMD/SMT 33PF 50V 5% 0603; Manufacturer: Yageo; Manufacturer Part Number: CC0603JRNPO9BN330; Type: General Purpose Surface-Mount Ceramic Multilayer Capacitor; Voltage Rating DC: 50 VDC; Class: Class 1; Dielectric: C0G (NP0); Supplier 1: Mouser; RoHS: RoHS Compliant; Category: Multilayer Ceramic Capacitors MLCC - SMD/SMT; Stock 1: 171498; Pricing 1: 1=0.100, 10=0.042, 100=0.019, 1000=0.015, 4000=0.011, 8000=0.010, 48000=0.009, 100000=0.007 (USD); Capacitance: 33 pF; Height: 0.8 mm; Length: 1.6 mm; Package / Case: 0603 (1608 metric); Packaging: Cut Tape; Product: General Type MLCCs; Series: CC; Termination Style: SMD/SMT; Tolerance: 5 %; Width: 0.8 mm; Brand: Yageo; Case Code - in: 0603; Case Code - mm: 1608; Maximum Operating Temperature: + 125 C; Minimum Operating Temperature: - 55 C; Product Type: Ceramic Capacitors; Standard Pack Qty: 4000; Subcategory: Capacitors; Termination: Standard; RoHS - Mouser: Y; Minimum Order Quantity: 1; Reeling: True; ComponentLink1URL: https://www.mouser.com/catalog/specsheets/yageo_yago-s-a0008592767-1.pdf; ComponentLink1Description: https://www.mouser.com/catalog/specsheets/yageo_yago-s-a0008592767-1.pdf; Supplier Part Number 1: 603-C0603JRNPO9BN330; Value: 33pF
footprint CAP0603 (Capacitor SMD 0603 ( imperal ))
pins: 1, 2

## CC0603JRNPO9BN471
designator C?, comment 470pF-0603
Multilayer Ceramic Capacitors MLCC - SMD/SMT 470PF 50V 5% 0603; Manufacturer: Yageo; Manufacturer Part Number: CC0603JRNPO9BN471; Type: General Purpose Surface-Mount Ceramic Multilayer Capacitor; Voltage Rating DC: 50 VDC; Capacitance - nF: 0.47 nF; Class: Class 1; Dielectric: C0G (NP0); Supplier 1: Mouser; RoHS: RoHS Compliant; Category: Multilayer Ceramic Capacitors MLCC - SMD/SMT; Stock 1: 0; Pricing 1: 1=0.130, 10=0.066, 100=0.030, 1000=0.025, 4000=0.018, 8000=0.015 (USD); Capacitance: 470 pF; Height: 0.8 mm; Length: 1.6 mm; Package / Case: 0603 (1608 metric); Packaging: Cut Tape; Product: General Type MLCCs; Series: CC; Termination Style: SMD/SMT; Tolerance: 5 %; Width: 0.8 mm; Brand: Yageo; Case Code - in: 0603; Case Code - mm: 1608; Maximum Operating Temperature: + 125 C; Minimum Operating Temperature: - 55 C; Product Type: Ceramic Capacitors; Standard Pack Qty: 4000; Subcategory: Capacitors; Termination: Standard; RoHS - Mouser: Y; Minimum Order Quantity: 1; Reeling: True; Supplier Part Number 1: 603-C0603JRNPO9BN471; Value: 470pF
footprint CAP0603 (Capacitor SMD 0603 ( imperal ))
pins: 1, 2

## CC0603JRNPO9BN680
designator C?, comment 68pF-0603
CAP CER 68PF 50V C0G/NPO 0603; Manufacturer: Yageo; Manufacturer Part Number: CC0603JRNPO9BN680; Tolerance: ±5%; Temperature Coefficient: C0G, NP0; Supplier 1: Digi-Key; RoHS: RoHS Compliant; Category: Capacitors; Stock 1: 91028; Pricing 1: 1=0.1, 10=0.023, 100=0.0102, 500=0.00728, 1000=0.00572 (USD); Packaging: Cut Tape (CT); Part Status: Active; Voltage - Rated: 50V; Operating Temperature: -55°C ~ 125°C; Features: -; Ratings: -; Applications: General Purpose; Failure Rate: -; Mounting Type: Surface Mount, MLCC; Package / Case: 0603 (1608 Metric); Size / Dimension: 0.063" L x 0.032" W (1.60mm x 0.80mm); Height - Seated (Max): -; Thickness (Max): 0.035" (0.90mm); Lead Spacing: -; Lead Style: -; ComponentLink1URL: http://www.yageo.com/documents/recent/UPY-GP_NP0_16V-to-50V_16.pdf; ComponentLink1Description: http://www.yageo.com/documents/recent/UPY-GP_NP0_16V-to-50V_16.pdf; Supplier Part Number 1: 311-1067-1-ND; Value: 68pF
footprint CAP0603 (Capacitor SMD 0603 ( imperal ))
pins: 1, 2

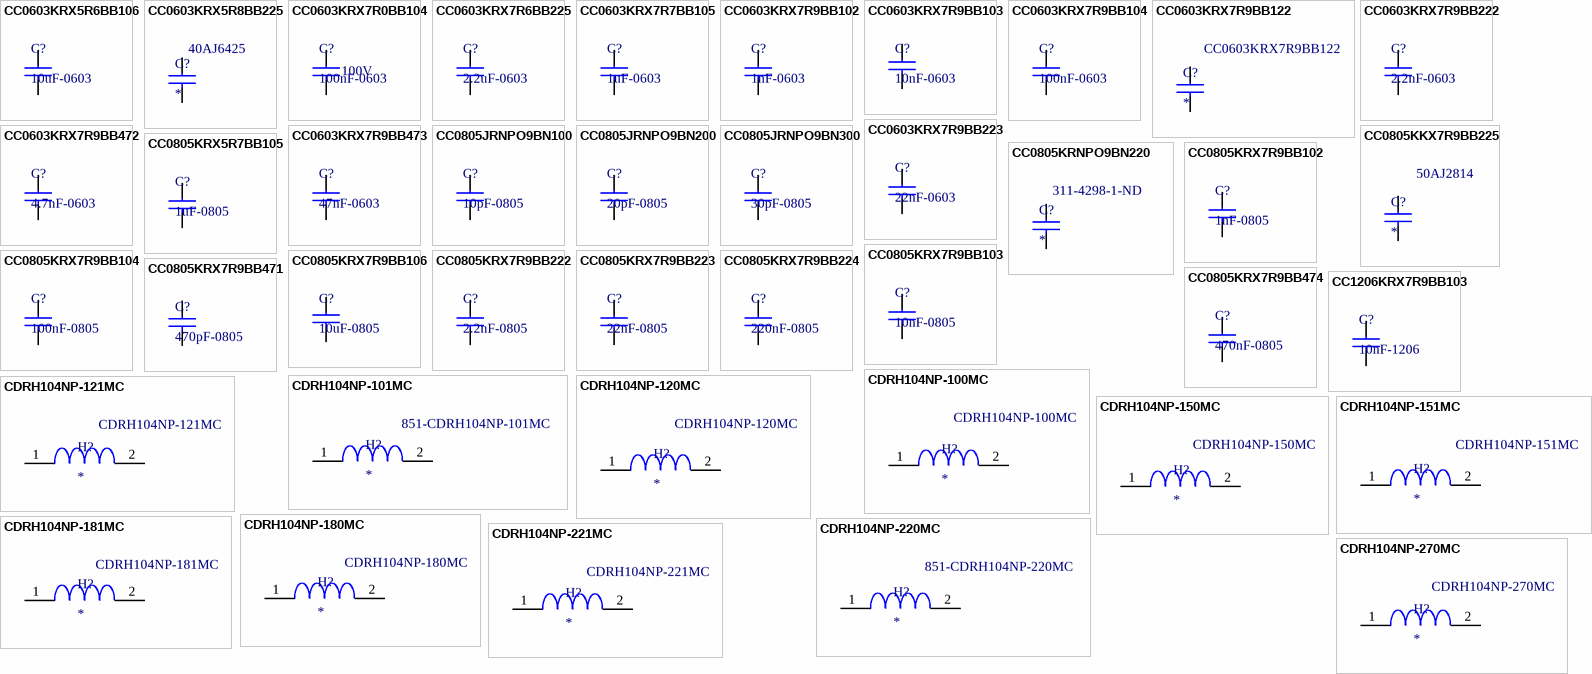
[diagram p4: symbols CC0603KRX5R6BB106 to CDRH104NP-270MC]

## CC0603KRX5R6BB106
designator C?, comment 10uF-0603
CAP CER 10UF 10V X5R 0603; Manufacturer 1: Yageo; Manufacturer Part Number 1: CC0603KRX5R6BB106; Category 1: Capacitors; Capacitance: 10µF; Tolerance: ±10%; Supplier 1: Digi-Key; Supplier Part Number 1: 311-1782-1-ND; RoHS 1: RoHS Compliant; Description 1: CAP CER 10UF 10V X5R 0603; Stock 1: 66566; Pricing 1: 1=0.33, 10=0.225, 100=0.1272, 500=0.08982, 1000=0.07858 (USD); Packaging: Cut Tape (CT); Part Status: Active; Voltage - Rated: 10V; Temperature Coefficient: X5R; Operating Temperature: -55°C ~ 85°C; Features: -; Ratings: -; Applications: General Purpose; Failure Rate: -; Mounting Type: Surface Mount, MLCC; Package / Case: 0603 (1608 Metric); Size / Dimension: 0.063" L x 0.031" W (1.60mm x 0.80mm); Height - Seated (Max): -; Thickness (Max): 0.035" (0.90mm); Lead Spacing: -; Lead Style: -; ComponentLink1URL: http://www.yageo.com/documents/recent/UPY-GPHC_X5R_4V-to-50V_24.pdf; ComponentLink1Description: http://www.yageo.com/documents/recent/UPY-GPHC_X5R_4V-to-50V_24.pdf; Value: 10uF
footprint CAP0603 (Capacitor SMD 0603 ( imperal ))
pins: 1, 2

## CC0603KRX5R8BB225
designator C?  Supplier Part Number 1: 40AJ6425
Cap Ceramic 2.2uF 25V X5R 10% SMD 0603 85C Paper T/R; Manufacturer: Yageo; Manufacturer Part Number: CC0603KRX5R8BB225; Supplier 1: Newark; RoHS: Yes; Category: Ceramic Capacitors; Stock 1: 12782; Pricing 1: 1=0.14100, 10=0.07700, 25=0.06300, 50=0.05100, 100=0.04100 (USD); Mount: Surface Mount; Case/Package: 0603; Case Code (Metric): 1608; Case Code (Imperial): 0603; Weight: 7.1E-05oz; Min Operating Temperature: -55°C; Max Operating Temperature: 85°C; Tolerance: 10%; Packaging: Tape and Reel; Capacitance: 2.2uF; Dielectric: X5R; Voltage Rating: 25V; Termination: SMD/SMT; Resistor Type: Ceramic; Voltage Rating (DC): 25V; Package Quantity: 4000; Length: 1.6mm; Width: 0.031inch; Thickness: 0.037inch; Depth: 0.8mm; Radiation Hardening: No; Lead Free: Lead Free; Halogen Free: Halogen Free; RoHS Compliant: Yes; ComponentLink1URL: https://datasheet.ciiva.com/26936/getdatasheetpartid-782757-26936061.pdf?src-supplier=Verical; ComponentLink1Description: https://datasheet.ciiva.com/26936/getdatasheetpartid-782757-26936061.pdf?src-supplier=Verical
footprint CAP0603 (Capacitor SMD 0603 ( imperal ))
pins: 1, 2

## CC0603KRX7R0BB104
designator C?, comment 100nF-0603  Voltage - Rated: 100V
CAP CER 0.1UF 100V X7R 0603; Manufacturer: Yageo; Manufacturer Part Number: CC0603KRX7R0BB104; Tolerance: ±10%; Value: 100nF; Supplier 1: Digi-Key; RoHS: RoHS Compliant; Category: Capacitors; Stock 1: 784508; Pricing 1: 1=0.23, 10=0.156, 100=0.0791, 500=0.05414, 1000=0.0479 (USD); Packaging: Cut Tape (CT); Part Status: Active; Temperature Coefficient: X7R; Operating Temperature: -55°C ~ 125°C; Features: -; Ratings: -; Applications: General Purpose; Failure Rate: -; Mounting Type: Surface Mount, MLCC; Package / Case: 0603 (1608 Metric); Size / Dimension: 0.063" L x 0.032" W (1.60mm x 0.80mm); Height - Seated (Max): -; Thickness (Max): 0.035" (0.90mm); Lead Spacing: -; Lead Style: -; ComponentLink1URL: http://media.digikey.com/pdf/Data%20Sheets/Yageo%20PDFs/NPO,%20X7R%20Mid-voltage.pdf; ComponentLink1Description: http://media.digikey.com/pdf/Data%20Sheets/Yageo%20PDFs/NPO,%20X7R%20Mid-voltage.pdf; Supplier Part Number 1: 311-1523-1-ND
footprint CAP0603 (Capacitor SMD 0603 ( imperal ))
pins: 1, 2

## CC0603KRX7R6BB225
designator C?, comment 2.2uF-0603
CAP CER 2.2UF 10V X7R 0603; Manufacturer 1: Yageo; Manufacturer Part Number 1: CC0603KRX7R6BB225; Category 1: Capacitors; Capacitance: 2.2µF; Tolerance: ±10%; Supplier 1: Digi-Key; Supplier Part Number 1: 311-1797-1-ND; RoHS 1: RoHS Compliant; Description 1: CAP CER 2.2UF 10V X7R 0603; Stock 1: 14291; Pricing 1: 1=0.32, 10=0.219, 100=0.1238, 500=0.0874, 1000=0.07648 (USD); Packaging: Cut Tape (CT); Part Status: Active; Voltage - Rated: 10V; Temperature Coefficient: X7R; Operating Temperature: -55°C ~ 125°C; Features: -; Ratings: -; Applications: General Purpose; Failure Rate: -; Mounting Type: Surface Mount, MLCC; Package / Case: 0603 (1608 Metric); Size / Dimension: 0.063" L x 0.031" W (1.60mm x 0.80mm); Height - Seated (Max): -; Thickness (Max): 0.035" (0.90mm); Lead Spacing: -; Lead Style: -; ComponentLink1URL: http://www.yageo.com/documents/recent/UPY-GPHC_X7R_6.3V-to-50V_18.pdf; ComponentLink1Description: http://www.yageo.com/documents/recent/UPY-GPHC_X7R_6.3V-to-50V_18.pdf; Value: 2.2uF
footprint CAP0603 (Capacitor SMD 0603 ( imperal ))
pins: 1, 2

## CC0603KRX7R7BB105
designator C?, comment 1uF-0603
CAP CER 1UF 16V X7R 0603; Manufacturer 1: Yageo; Manufacturer Part Number 1: CC0603KRX7R7BB105; Category 1: Capacitors; Capacitance: 1µF; Tolerance: ±10%; Supplier 1: Digi-Key; Supplier Part Number 1: 311-1446-1-ND; RoHS 1: RoHS Compliant; Description 1: CAP CER 1UF 16V X7R 0603; Stock 1: 274580; Pricing 1: 1=0.1, 10=0.051, 100=0.0227, 500=0.0162, 1000=0.01274 (USD); Packaging: Cut Tape (CT); Part Status: Active; Voltage - Rated: 16V; Temperature Coefficient: X7R; Operating Temperature: -55°C ~ 125°C; Features: -; Ratings: -; Applications: General Purpose; Failure Rate: -; Mounting Type: Surface Mount, MLCC; Package / Case: 0603 (1608 Metric); Size / Dimension: 0.063" L x 0.031" W (1.60mm x 0.80mm); Height - Seated (Max): -; Thickness (Max): 0.035" (0.90mm); Lead Spacing: -; Lead Style: -; ComponentLink1URL: http://www.yageo.com/documents/recent/UPY-GPHC_X7R_6.3V-to-50V_18.pdf; ComponentLink1Description: http://www.yageo.com/documents/recent/UPY-GPHC_X7R_6.3V-to-50V_18.pdf; Value: 1uF
footprint CAP0603 (Capacitor SMD 0603 ( imperal ))
pins: 1, 2

## CC0603KRX7R9BB102
designator C?, comment 1nF-0603
CAP CER 1000PF 50V X7R 0603; Manufacturer: Yageo; Manufacturer Part Number: CC0603KRX7R9BB102; Tolerance: ±10%; Notification: Current market demand for these product types have resulted in fluctuating and extending lead times. Lead times may differ.; Supplier 1: Digi-Key; RoHS: RoHS Compliant; Category: Capacitors; Stock 1: 0; Pricing 1: 1=0.1, 10=0.028, 100=0.0126, 500=0.009, 1000=0.00708 (USD); Packaging: Cut Tape (CT); Part Status: Active; Voltage - Rated: 50V; Temperature Coefficient: X7R; Operating Temperature: -55°C ~ 125°C; Features: -; Ratings: -; Applications: General Purpose; Failure Rate: -; Mounting Type: Surface Mount, MLCC; Package / Case: 0603 (1608 Metric); Size / Dimension: 0.063" L x 0.032" W (1.60mm x 0.80mm); Height - Seated (Max): -; Thickness (Max): 0.035" (0.90mm); Lead Spacing: -; Lead Style: -; ComponentLink1URL: http://www.yageo.com/documents/recent/UPY-GPHC_X7R_6.3V-to-50V_18.pdf; ComponentLink1Description: http://www.yageo.com/documents/recent/UPY-GPHC_X7R_6.3V-to-50V_18.pdf; Supplier Part Number 1: 311-1080-1-ND
footprint CAP0603 (Capacitor SMD 0603 ( imperal ))
pins: 1, 2

## CC0603KRX7R9BB103
designator C?, comment 10nF-0603
CAP CER 10000PF 50V X7R 0603; Manufacturer 1: Yageo; Manufacturer Part Number 1: CC0603KRX7R9BB103; Category 1: Capacitors; Tolerance: ±10%; Value: 10nF; Supplier 1: Digi-Key; Supplier Part Number 1: 311-1085-1-ND; RoHS 1: RoHS Compliant; Description 1: CAP CER 10000PF 50V X7R 0603; Stock 1: 2767317; Pricing 1: 1=0.1, 10=0.02, 100=0.009, 500=0.00644, 1000=0.00506 (USD); Packaging: Cut Tape (CT); Part Status: Active; Capacitance: 10000pF; Voltage - Rated: 50V; Temperature Coefficient: X7R; Operating Temperature: -55°C ~ 125°C; Features: -; Ratings: -; Applications: General Purpose; Failure Rate: -; Mounting Type: Surface Mount, MLCC; Package / Case: 0603 (1608 Metric); Size / Dimension: 0.063" L x 0.031" W (1.60mm x 0.80mm); Height - Seated (Max): -; Thickness (Max): 0.035" (0.90mm); Lead Spacing: -; Lead Style: -; ComponentLink1URL: http://www.yageo.com/documents/recent/UPY-GPHC_X7R_6.3V-to-50V_18.pdf; ComponentLink1Description: http://www.yageo.com/documents/recent/UPY-GPHC_X7R_6.3V-to-50V_18.pdf
footprint CAP0603 (Capacitor SMD 0603 ( imperal ))
pins: 1, 2

## CC0603KRX7R9BB104
designator C?, comment 100nF-0603
CAP CER 0.1UF 50V X7R 0603; Manufacturer 1: Yageo; Manufacturer Part Number 1: CC0603KRX7R9BB104; Category 1: Capacitors; Capacitance: 0.1µF; Tolerance: ±10%; Value: 100nF; Supplier 1: Digi-Key; Supplier Part Number 1: 311-1344-1-ND; RoHS 1: RoHS Compliant; Description 1: CAP CER 0.1UF 50V X7R 0603; Stock 1: 4411645; Pricing 1: 1=0.1, 10=0.031, 100=0.014, 500=0.00998, 1000=0.00783 (USD); Packaging: Cut Tape (CT); Part Status: Active; Voltage - Rated: 50V; Temperature Coefficient: X7R; Operating Temperature: -55°C ~ 125°C; Features: -; Ratings: -; Applications: General Purpose; Failure Rate: -; Mounting Type: Surface Mount, MLCC; Package / Case: 0603 (1608 Metric); Size / Dimension: 0.063" L x 0.031" W (1.60mm x 0.80mm); Height - Seated (Max): -; Thickness (Max): 0.035" (0.90mm); Lead Spacing: -; Lead Style: -; ComponentLink1URL: http://www.yageo.com/documents/recent/UPY-GPHC_X7R_6.3V-to-50V_18.pdf; ComponentLink1Description: http://www.yageo.com/documents/recent/UPY-GPHC_X7R_6.3V-to-50V_18.pdf
footprint CAP0603 (Capacitor SMD 0603 ( imperal ))
pins: 1, 2

## CC0603KRX7R9BB122
designator C?  Supplier Part Number 1: CC0603KRX7R9BB122
Surface Mount Ceramic Multilayer Capacitor 0.0012uF 10% X7R 50V 0603 Paper T/R; Manufacturer: Yageo; Capacitance: 1.2nF; Insulation Resistance: 100GR; Supplier 1: Arrow Electronics; Manufacturer Part Number: CC0603KRX7R9BB122; RoHS: Yes; Category: Ceramic Capacitors; Stock 1: 2967; Pricing 1: 1=0.08590, 10=0.04400, 25=0.04260, 100=0.02850, 250=0.02670, 500=0.01880, 1000=0.01780 (USD); Mount: Surface Mount; Case/Package: 0603; Case Code (Metric): 1608; Case Code (Imperial): 0603; Weight: 7.1E-05oz; Dielectric Material: Ceramic; Min Operating Temperature: -55°C; Max Operating Temperature: 125°C; Tolerance: 10%; Dielectric: X7R; Voltage Rating: 50V; Voltage Rating (DC): 50V; Packaging: Tape and Reel; Package Quantity: 4000; Termination: SMD/SMT; Resistor Type: Ceramic; Series: CC; Construction: Flat; Length: 1.6mm; Width: 0.031inch; Height: 0.8mm; Thickness: 0.035inch; Depth: 0.8mm; Radiation Hardening: No; Lead Free: Lead Free; Halogen Free: Halogen Free; RoHS Compliant: Yes; ComponentLink1URL: https://datasheet.ciiva.com/8033/1489800-8033829.pdf?src-supplier=Element14; ComponentLink1Description: https://datasheet.ciiva.com/8033/1489800-8033829.pdf?src-supplier=Element14; ComponentLink2URL: https://datasheet.ciiva.com/13209/upy-gphc-x7r-6-3v-to-50v-8-12304-13209023.pdf?src-supplier=Mouser; ComponentLink2Description: https://datasheet.ciiva.com/13209/upy-gphc-x7r-6-3v-to-50v-8-12304-13209023.pdf?src-supplier=Mouser
footprint CAP0603 (Capacitor SMD 0603 ( imperal ))
pins: 1, 2